# Altium footprint library North POLE.PcbLib: 419 footprints (part 3 of 27)
Each footprint in its own frame and in the unit in brackets; x right, y up, seen from the top. Pads: shape width x height; smd on the part's side, far side on the other; paste and mask are expansions set on the pad; w line width, h text height; cw(c..) or ccw(c..) is an arc to the next point about the centre after c.
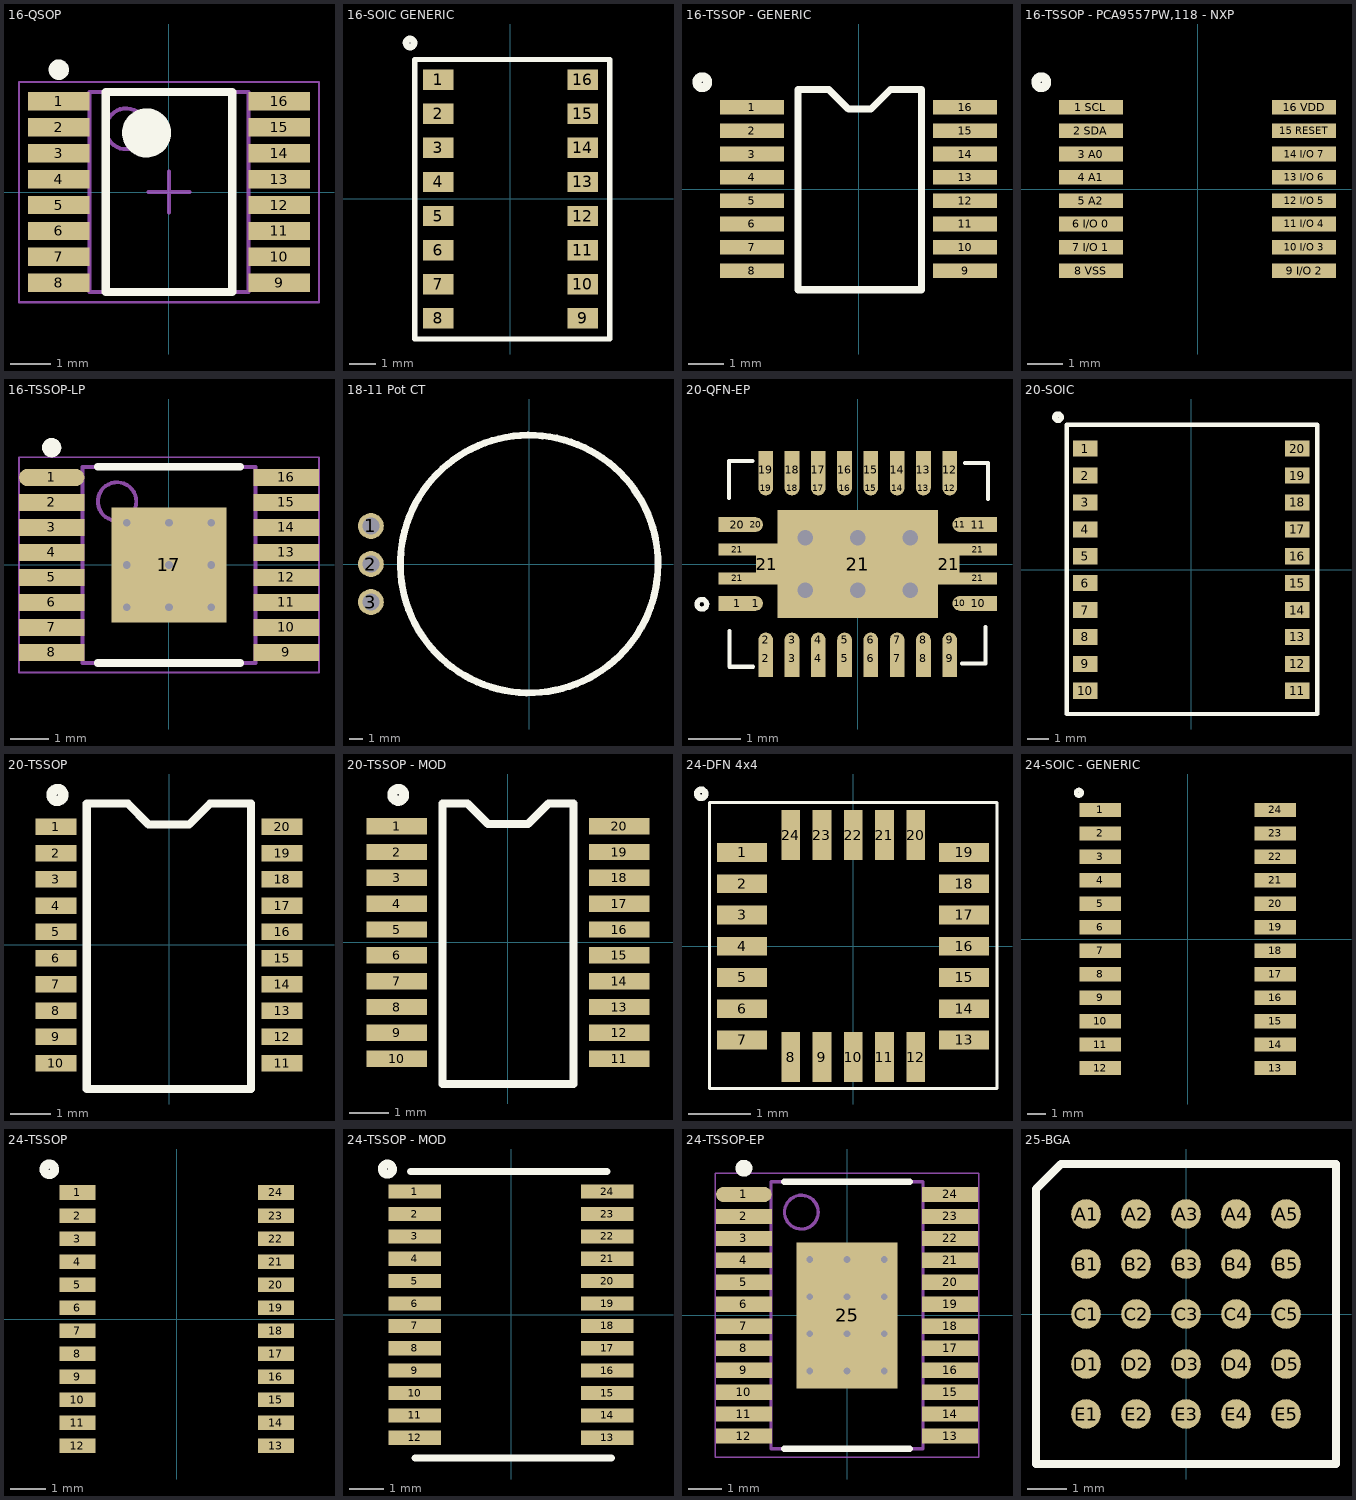
[diagram p2: the footprints below, top view; thin cyan lines are the x and y axes]

## 16-QSOP [mm]
height 1.75
pads (16):
  rect 1.5x0.45 smd: 1(-2.7,2.222) 2(-2.7,1.587) 3(-2.7,0.953) 4(-2.7,0.318) 5(-2.7,-0.318) 6(-2.7,-0.953) 7(-2.7,-1.587) 8(-2.7,-2.222) 9(2.7,-2.222) 10(2.7,-1.587) 11(2.7,-0.953) 12(2.7,-0.318) 13(2.7,0.318) 14(2.7,0.953) 15(2.7,1.587) 16(2.7,2.222)
Top Overlay:
  circle w0.6: c-0.55,1.45 r0.3
  circle w0.25: c-2.7,2.997 r0.125
  lines w0.2: -1.55,-2.45 1.55,-2.45 1.55,2.45 -1.55,2.45 -1.55,-2.45
Mechanical 13:
  circle w0.1: c-1.05,1.55 r0.5
  lines w0.1: -1.95,-2.45 1.95,-2.45 1.95,2.45 -1.95,2.45 -1.95,-2.45
Mechanical 15:
  lines w0.05: -3.675,-2.7 3.675,-2.7 3.675,2.7 -3.675,2.7 -3.675,-2.7
  lines w0.1: -0.5,0 0.5,0 ; 0,-0.5 0,0.5
3D body: height 1.81, standoff 0.04, extent -3.035,-2.491 2.985,2.489

## 16-SOIC GENERIC [mil]
pads (16):
  rect 45x30 smd: 1(-106.3,175) 2(-106.3,125) 3(-106.3,75) 4(-106.3,25) 5(-106.3,-25) 6(-106.3,-75) 7(-106.3,-125) 8(-106.3,-175) 9(106.3,-175) 10(106.3,-125) 11(106.3,-75) 12(106.3,-25) 13(106.3,25) 14(106.3,75) 15(106.3,125) 16(106.3,175)
Top Overlay:
  lines w7.87: -140.71,-205.67 146.1,-205.67 146.1,204.92 -140.71,204.92 -140.71,-205.67
  lines w10: -143.85,233.81 ccw(c-147.43,229.21) -143,233
3D body: height 55.12, standoff 0, extent -115.31,-195.87 120.91,193.89

## 16-TSSOP - GENERIC [mm]
pads (16):
  rect 1.78x0.41 smd: 1(-2.97,2.275) 2(-2.97,1.625) 3(-2.97,0.975) 4(-2.97,0.325) 5(-2.97,-0.325) 6(-2.97,-0.975) 7(-2.97,-1.625) 8(-2.97,-2.275) 9(2.97,-2.275) 10(2.97,-1.625) 11(2.97,-0.975) 12(2.97,-0.325) 13(2.97,0.325) 14(2.97,0.975) 15(2.97,1.625) 16(2.97,2.275)
Top Overlay:
  lines w0.2: -1.691,-2.807 1.755,-2.807 1.755,2.776 0.894,2.776 0.348,2.23 -0.284,2.23 -0.83,2.776 -1.691,2.776 -1.691,-2.807
  lines w0.254: -4.263,3.094 ccw(c-4.354,2.977) -4.242,3.073

## 16-TSSOP - PCA9557PW,118 - NXP [mm]
pads (16):
  rect 1.78x0.41 smd: "1 SCL"(-2.97,2.275) "2 SDA"(-2.97,1.625) "3 A0"(-2.97,0.975) "4 A1"(-2.97,0.325) "5 A2"(-2.97,-0.325) "6 I/O 0"(-2.97,-0.975) "7 I/O 1"(-2.97,-1.625) "8 VSS"(-2.97,-2.275) "9 I/O 2"(2.97,-2.275) "10 I/O 3"(2.97,-1.625) "11 I/O 4"(2.97,-0.975) "12 I/O 5"(2.97,-0.325) "13 I/O 6"(2.97,0.325) "14 I/O 7"(2.97,0.975) "15 RESET"(2.97,1.625) "16 VDD"(2.97,2.275)
Top Overlay:
  lines w0.254: -4.263,3.094 ccw(c-4.354,2.977) -4.242,3.073

## 16-TSSOP-LP [mm] "Allegro A4954ELPTR-T"
height 1.2
pads (17):
  oval 1.7x0.45 smd: 1(-3.05,2.275)
  rect 1.7x0.45 smd: 2(-3.05,1.625) 3(-3.05,0.975) 4(-3.05,0.325) 5(-3.05,-0.325) 6(-3.05,-0.975) 7(-3.05,-1.625) 8(-3.05,-2.275) 9(3.05,-2.275) 10(3.05,-1.625) 11(3.05,-0.975) 12(3.05,-0.325) 13(3.05,0.325) 14(3.05,0.975) 15(3.05,1.625) 16(3.05,2.275)
  rect 3x3 smd: 17(0,0)
via 1.1,-1.1 diameter 0.5 hole 0.2
via 0,-1.1 diameter 0.5 hole 0.2
via -1.1,-1.1 diameter 0.5 hole 0.2
via 1.1,0 diameter 0.5 hole 0.2
via 0,0 diameter 0.5 hole 0.2
via -1.1,0 diameter 0.5 hole 0.2
via 1.1,1.1 diameter 0.5 hole 0.2
via 0,1.1 diameter 0.5 hole 0.2
via -1.1,1.1 diameter 0.5 hole 0.2
Top Overlay:
  circle w0.25: c-3.05,3.05 r0.125
  lines w0.2: -1.85,-2.55 1.85,-2.55 ; -1.85,2.55 1.85,2.55
Mechanical 13:
  circle w0.1: c-1.35,1.65 r0.5
  lines w0.1: -2.25,-2.55 2.25,-2.55 2.25,2.55 -2.25,2.55 -2.25,-2.55
Mechanical 15:
  lines w0.05: -3.9,-2.8 3.9,-2.8 3.9,2.8 -3.9,2.8 -3.9,-2.8
  lines w0.1: -0.5,0 0.5,0 ; 0,-0.5 0,0.5
3D body: height 1.1, standoff 0, extent -3.2,-2.51 3.2,2.49

## 18-11 Pot CT [mm]
pads (3):
  round 1.905 hole 1.27 mask+0.08: 1(-11.7,2.81) 2(-11.7,0) 3(-11.7,-2.81)
Top Overlay:
  lines w0.508: 9.155,2.63 ccw(c0,0) 9.165,2.593
3D body: height 5.4, standoff 0.1, extent -8.933,-9.2 8.933,9.2

## 20-QFN-EP [mm] "quad flatpack, no-lead, with thermal pad"
pads (47):
  rect 0.71x0.28 smd paste+0 mask+0.05: 1(-2.295,-0.75) 10(2.295,-0.75) 11(2.295,0.75) 20(-2.295,0.75)
  round 0.28 smd mask+0.05: 1(-1.944,-0.75) 2(-1.75,-1.444) 3(-1.25,-1.444) 4(-0.75,-1.444) 5(-0.25,-1.444) 6(0.25,-1.444) 7(0.75,-1.444) 8(1.25,-1.444) 9(1.75,-1.444) 10(1.944,-0.75) 11(1.944,0.75) 12(1.75,1.444) 13(1.25,1.444) 14(0.75,1.444) 15(0.25,1.444) 16(-0.25,1.444) 17(-0.75,1.444) 18(-1.25,1.444) 19(-1.75,1.444) 20(-1.944,0.75)
  rect 0.28x0.71 smd paste+0 mask+0.05: 2(-1.75,-1.795) 3(-1.25,-1.795) 4(-0.75,-1.795) 5(-0.25,-1.795) 6(0.25,-1.795) 7(0.75,-1.795) 8(1.25,-1.795) 9(1.75,-1.795) 12(1.75,1.795) 13(1.25,1.795) 14(0.75,1.795) 15(0.25,1.795) 16(-0.25,1.795) 17(-0.75,1.795) 18(-1.25,1.795) 19(-1.75,1.795)
  rect 0.725x0.23 smd paste+0 mask+0.05: 21(-2.288,-0.275) 21(-2.288,0.275) 21(2.288,-0.275) 21(2.288,0.275)
  rect 0.42x0.78 smd paste+0 mask+0.05: 21(-1.729,0) 21(1.729,0)
  rect 3.05x2.05 smd mask+0.05: 21(0,0)
via 0,-0.5 diameter 0.45 hole 0.3
via 1,0.5 diameter 0.45 hole 0.3
via 1,-0.5 diameter 0.45 hole 0.3
via -1,-0.5 diameter 0.45 hole 0.3
via 0,0.5 diameter 0.45 hole 0.3
via -1,0.5 diameter 0.45 hole 0.3
Top Overlay:
  lines w0.076: -2.449,1.259 -2.449,1.957 -1.999,1.957 ; -2.437,-1.274 -2.437,-1.955 -1.994,-1.955 ; 1.983,-1.896 2.433,-1.896 2.433,-1.198 ; 2.038,1.92 2.481,1.92 2.481,1.239
  lines w0.1: -2.916,-0.689 ccw(c-2.966,-0.766) -2.888,-0.718
3D body: height 1, standoff 0, extent -2.301,-1.842 2.32,1.84

## 20-SOIC [mil]
pads (20):
  rect 45x30 smd: 1(-196.85,225) 2(-196.85,175) 3(-196.85,125) 4(-196.85,75) 5(-196.85,25) 6(-196.85,-25) 7(-196.85,-75) 8(-196.85,-125) 9(-196.85,-175) 10(-196.85,-225) 11(196.85,-225) 12(196.85,-175) 13(196.85,-125) 14(196.85,-75) 15(196.85,-25) 16(196.85,25) 17(196.85,75) 18(196.85,125) 19(196.85,175) 20(196.85,225)
Top Overlay:
  lines w7.87: -231.61,-268.23 -231.61,269.37 233.98,269.37 233.98,-268.23 -231.61,-268.23
  lines w10: -244.1,288.1 ccw(c-247.68,283.5) -243.25,287.29
3D body: height 101.38, standoff -0.98, extent -210.46,-256.8 206.86,255.01

## 20-TSSOP [mm]
pads (20):
  rect 1.02x0.41 smd: 1(-2.8,2.925) 2(-2.8,2.275) 3(-2.8,1.625) 4(-2.8,0.975) 5(-2.8,0.325) 6(-2.8,-0.325) 7(-2.8,-0.975) 8(-2.8,-1.625) 9(-2.8,-2.275) 10(-2.8,-2.925) 11(2.8,-2.925) 12(2.8,-2.275) 13(2.8,-1.625) 14(2.8,-0.975) 15(2.8,-0.325) 16(2.8,0.325) 17(2.8,0.975) 18(2.8,1.625) 19(2.8,2.275) 20(2.8,2.925)
Top Overlay:
  lines w0.2: -2.037,-3.566 -2.037,3.497 -1.019,3.497 -0.503,2.981 0.5,2.981 1.016,3.497 2.034,3.497 2.034,-3.566 -2.037,-3.566
  lines w0.254: -2.671,3.83 ccw(c-2.761,3.713) -2.649,3.809
3D body: height 1, standoff 0, extent -3.205,-3.25 3.205,3.25

## 20-TSSOP - MOD [mm]
pads (20):
  rect 1.524x0.41 smd: 1(-2.8,2.925) 2(-2.8,2.275) 3(-2.8,1.625) 4(-2.8,0.975) 5(-2.8,0.325) 6(-2.8,-0.325) 7(-2.8,-0.975) 8(-2.8,-1.625) 9(-2.8,-2.275) 10(-2.8,-2.925) 11(2.8,-2.925) 12(2.8,-2.275) 13(2.8,-1.625) 14(2.8,-0.975) 15(2.8,-0.325) 16(2.8,0.325) 17(2.8,0.975) 18(2.8,1.625) 19(2.8,2.275) 20(2.8,2.925)
Top Overlay:
  lines w0.2: -1.65,-3.566 1.65,-3.566 1.65,3.497 1.016,3.497 0.5,2.981 -0.503,2.981 -1.019,3.497 -1.65,3.497 -1.65,-3.566
  lines w0.254: -2.671,3.83 ccw(c-2.761,3.713) -2.649,3.809
3D body: height 1, standoff 0, extent -3.205,-3.25 3.205,3.25

## 24-DFN 4x4 [mm]
pads (24):
  rect 0.8x0.3 smd mask+0.04: 1(-1.775,1.5) 2(-1.775,1) 3(-1.775,0.5) 4(-1.775,0) 5(-1.775,-0.5) 6(-1.775,-1) 7(-1.775,-1.5) 13(1.775,-1.5) 14(1.775,-1) 15(1.775,-0.5) 16(1.775,0) 17(1.775,0.5) 18(1.775,1) 19(1.775,1.5)
  rect 0.3x0.8 smd mask+0.04: 8(-1,-1.775) 9(-0.5,-1.775) 10(0,-1.775) 11(0.5,-1.775) 12(1,-1.775) 20(1,1.775) 21(0.5,1.775) 22(0,1.775) 23(-0.5,1.775) 24(-1,1.775)
Top Overlay:
  lines w0.05: -2.3,-2.275 -2.3,2.3 2.3,2.3 2.3,-2.275 -2.3,-2.275
  lines w0.1: -2.397,2.496 ccw(c-2.431,2.438) -2.375,2.475
Top Solder:
  region: -2.225,1.7 -1.2,1.7 -1.2,2.225 1.2,2.225 1.2,1.7 2.225,1.7 2.225,-1.7 1.2,-1.7 1.2,-2.225 -1.2,-2.225 -1.2,-1.7 -2.225,-1.7
3D body: height 1, standoff 0, extent -2,-2 2,2

## 24-SOIC - GENERIC [mm]
pads (24):
  rect 2.25x0.762 smd: 1(-4.731,6.985) 2(-4.731,5.715) 3(-4.731,4.445) 4(-4.731,3.175) 5(-4.731,1.905) 6(-4.731,0.635) 7(-4.731,-0.635) 8(-4.731,-1.905) 9(-4.731,-3.175) 10(-4.731,-4.445) 11(-4.731,-5.715) 12(-4.731,-6.985) 13(4.731,-6.985) 14(4.731,-5.715) 15(4.731,-4.445) 16(4.731,-3.175) 17(4.731,-1.905) 18(4.731,-0.635) 19(4.731,0.635) 20(4.731,1.905) 21(4.731,3.175) 22(4.731,4.445) 23(4.731,5.715) 24(4.731,6.985)
Top Overlay:
  lines w0.254: -5.787,8.022 ccw(c-5.878,7.905) -5.766,8.001
3D body: height 2.6, standoff 0, extent -5.2,-7.856 5.2,7.544

## 24-TSSOP [mm]
pads (24):
  rect 1.02x0.41 smd: 1(-2.8,3.575) 2(-2.8,2.925) 3(-2.8,2.275) 4(-2.8,1.625) 5(-2.8,0.975) 6(-2.8,0.325) 7(-2.8,-0.325) 8(-2.8,-0.975) 9(-2.8,-1.625) 10(-2.8,-2.275) 11(-2.8,-2.925) 12(-2.8,-3.575) 13(2.8,-3.575) 14(2.8,-2.925) 15(2.8,-2.275) 16(2.8,-1.625) 17(2.8,-0.975) 18(2.8,-0.325) 19(2.8,0.325) 20(2.8,0.975) 21(2.8,1.625) 22(2.8,2.275) 23(2.8,2.925) 24(2.8,3.575)
Top Overlay:
  lines w0.254: -3.501,4.348 ccw(c-3.592,4.231) -3.48,4.327
3D body: height 1.15, standoff -0.03, extent -3.203,-3.949 3.204,3.941

## 24-TSSOP - MOD [mm]
pads (24):
  rect 1.524x0.41 smd: 1(-2.8,3.575) 2(-2.8,2.925) 3(-2.8,2.275) 4(-2.8,1.625) 5(-2.8,0.975) 6(-2.8,0.325) 7(-2.8,-0.325) 8(-2.8,-0.975) 9(-2.8,-1.625) 10(-2.8,-2.275) 11(-2.8,-2.925) 12(-2.8,-3.575) 13(2.8,-3.575) 14(2.8,-2.925) 15(2.8,-2.275) 16(2.8,-1.625) 17(2.8,-0.975) 18(2.8,-0.325) 19(2.8,0.325) 20(2.8,0.975) 21(2.8,1.625) 22(2.8,2.275) 23(2.8,2.925) 24(2.8,3.575)
Top Overlay:
  lines w0.203: -2.921,4.166 2.794,4.166 ; -2.794,-4.166 2.921,-4.166
  lines w0.254: -3.501,4.348 ccw(c-3.592,4.231) -3.48,4.327
3D body: height 1.15, standoff -0.03, extent -3.203,-3.949 3.204,3.941

## 24-TSSOP-EP [mm] "Allegro A4984SLPTR-T"
height 1.2
pads (25):
  oval 1.65x0.45 smd: 1(-3.05,3.575)
  rect 1.65x0.45 smd: 2(-3.05,2.925) 3(-3.05,2.275) 4(-3.05,1.625) 5(-3.05,0.975) 6(-3.05,0.325) 7(-3.05,-0.325) 8(-3.05,-0.975) 9(-3.05,-1.625) 10(-3.05,-2.275) 11(-3.05,-2.925) 12(-3.05,-3.575) 13(3.05,-3.575) 14(3.05,-2.925) 15(3.05,-2.275) 16(3.05,-1.625) 17(3.05,-0.975) 18(3.05,-0.325) 19(3.05,0.325) 20(3.05,0.975) 21(3.05,1.625) 22(3.05,2.275) 23(3.05,2.925) 24(3.05,3.575)
  rect 3x4.32 smd: 25(0,0)
via -1.1,1.65 diameter 0.5 hole 0.2
via 0,1.65 diameter 0.5 hole 0.2
via 1.1,1.65 diameter 0.5 hole 0.2
via -1.1,0.55 diameter 0.5 hole 0.2
via 0,0.55 diameter 0.5 hole 0.2
via 1.1,0.55 diameter 0.5 hole 0.2
via -1.1,-0.55 diameter 0.5 hole 0.2
via 0,-0.55 diameter 0.5 hole 0.2
via 1.1,-0.55 diameter 0.5 hole 0.2
via -1.1,-1.65 diameter 0.5 hole 0.2
via 0,-1.65 diameter 0.5 hole 0.2
via 1.1,-1.65 diameter 0.5 hole 0.2
Top Overlay:
  circle w0.25: c-3.05,4.35 r0.125
  lines w0.2: -1.85,-3.95 1.85,-3.95 ; -1.85,3.95 1.85,3.95
Mechanical 13:
  circle w0.1: c-1.35,3.05 r0.5
  lines w0.1: -2.25,-3.95 -2.25,3.95 2.25,3.95 2.25,-3.95 -2.25,-3.95
Mechanical 15:
  lines w0.05: -3.9,-4.2 -3.9,4.2 3.9,4.2 3.9,-4.2 -3.9,-4.2
  lines w0.1: -0.5,0 0.5,0 ; 0,-0.5 0,0.5
3D body: height 1.15, standoff -0.03, extent -3.203,-3.949 3.204,3.941

## 25-BGA [mm]
pads (25):
  round 0.75 smd: A1(-2.54,2.54) A2(-1.27,2.54) A3(0,2.54) A4(1.27,2.54) A5(2.54,2.54) B1(-2.54,1.27) B2(-1.27,1.27) B3(0,1.27) B4(1.27,1.27) B5(2.54,1.27) C1(-2.54,0) C2(-1.27,0) C3(0,0) C4(1.27,0) C5(2.54,0) D1(-2.54,-1.27) D2(-1.27,-1.27) D3(0,-1.27) D4(1.27,-1.27) D5(2.54,-1.27) E1(-2.54,-2.54) E2(-1.27,-2.54) E3(0,-2.54) E4(1.27,-2.54) E5(2.54,-2.54)
Top Overlay:
  lines w0.2: -3.81,-3.81 3.81,-3.81 3.81,3.81 -3.175,3.81 -3.81,3.175 -3.81,-3.81
3D body: height 5.21, standoff 0.7, extent -3.131,-3.123 3.119,3.127